# Altium footprint library Connectors.PcbLib: 79 footprints (part 3 of 5)
Each footprint in its own frame and in the unit in brackets; x right, y up, seen from the top. Pads: shape width x height; smd on the part's side, far side on the other; paste and mask are expansions set on the pad; w line width, h text height; cw(c..) or ccw(c..) is an arc to the next point about the centre after c.
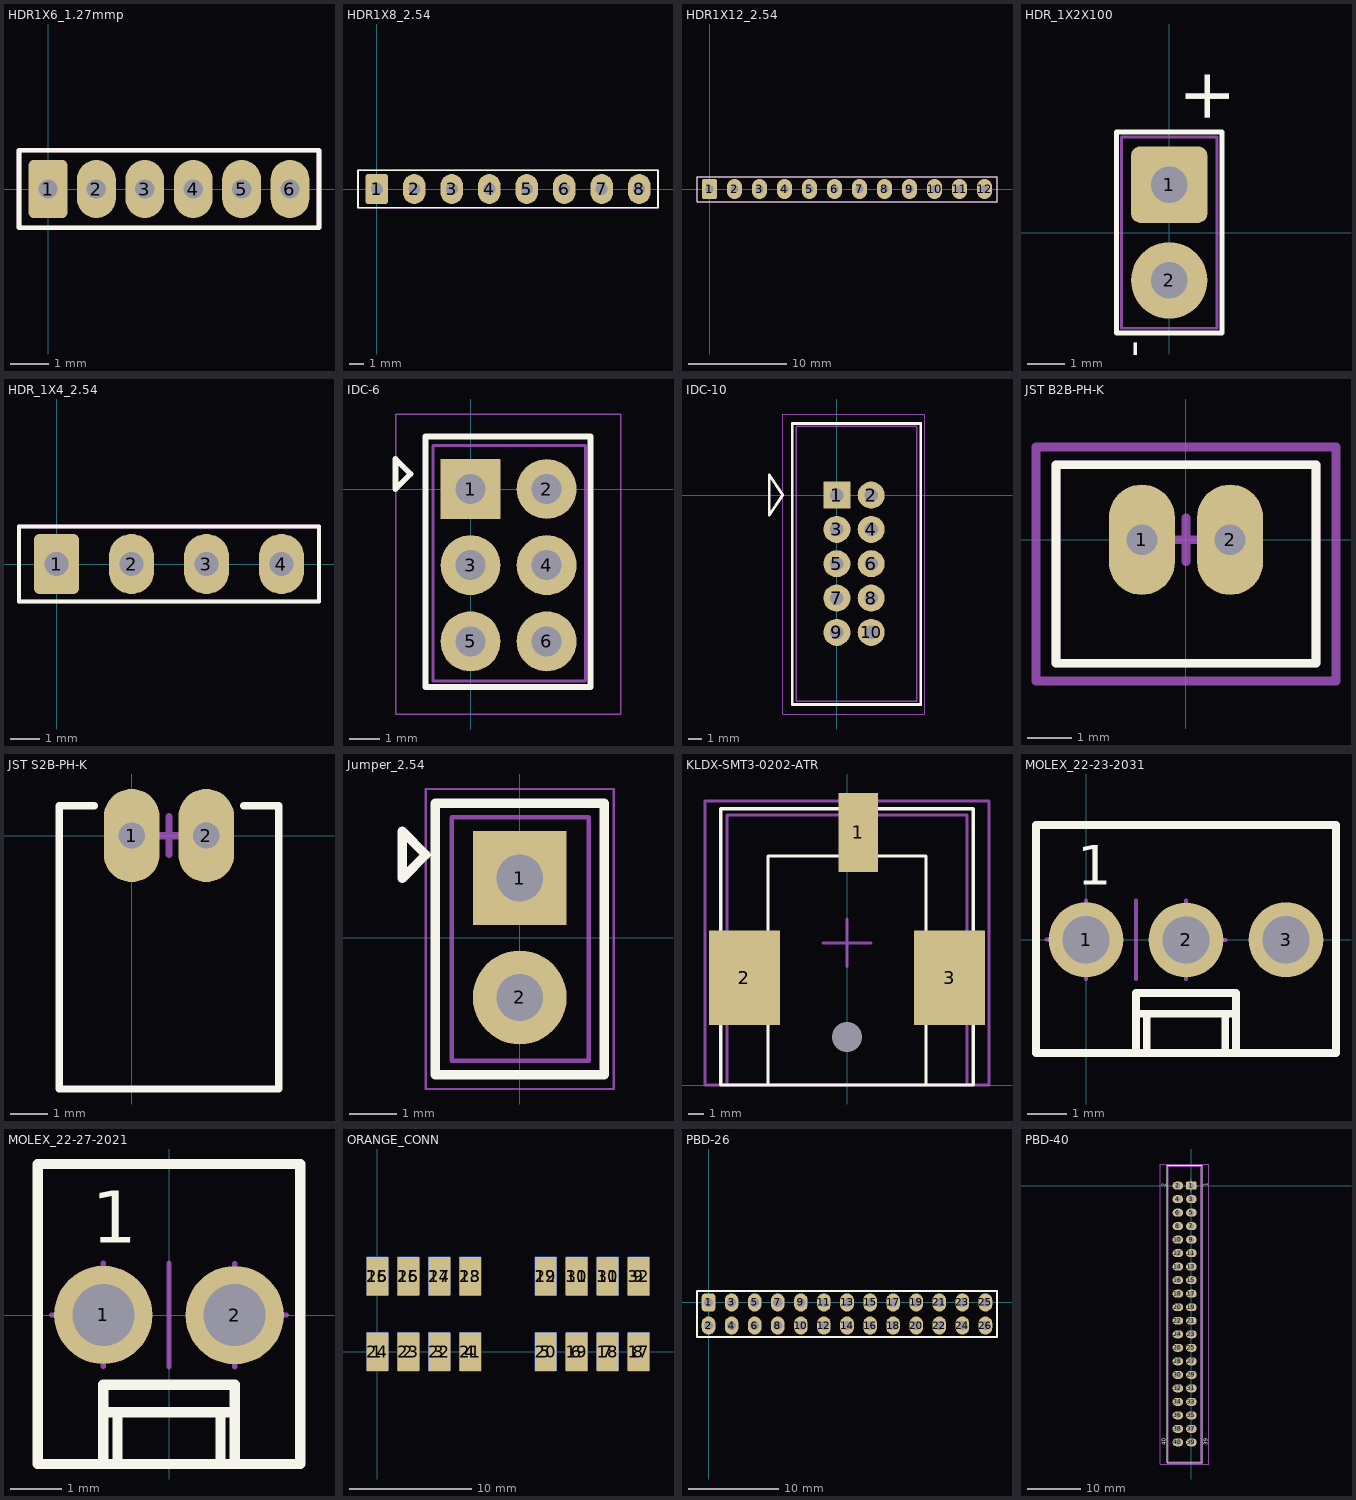
[diagram p2: the footprints below, top view; thin cyan lines are the x and y axes]

## HDR1X6_1.27mmp [mil] "Connector; Header; 6 Position, 0.050\" pitch"
pads (6):
  rrect25% 40x60 hole 20: 1(0,0)
  oval 40x60 hole 20: 2(50,0) 3(100,0) 4(150,0) 5(200,0) 6(250,0)
Top Overlay:
  lines w5: -30,-40 -30,40 280,40 280,-40 -30,-40
Bottom Solder:
  rectangle: 0,-30 250,30
Mechanical 13:
  lines w5: -30,-40 -30,40 280,40 280,-40 -30,-40

## HDR1X8_2.54 [mil]
pads (8):
  rrect25% 60x80 hole 32: 1(0,0)
  oval 60x80 hole 32: 2(100,0) 3(200,0) 4(300,0) 5(400,0) 6(500,0) 7(600,0) 8(700,0)
Top Overlay:
  lines w5: -50,-50 750,-50 750,50 -50,50 -50,-50
Mechanical 13:
  lines w5: -50,-50 750,-50 750,50 -50,50 -50,-50

## HDR1X12_2.54 [mil]
pads (12):
  rrect25% 60x80 hole 32: 1(0,0)
  oval 60x80 hole 32: 2(100,0) 3(200,0) 4(300,0) 5(400,0) 6(500,0) 7(600,0) 8(700,0) 9(800,0) 10(900,0) 11(1000,0) 12(1100,0)
Top Overlay:
  lines w5: -50,-50 1150,-50 1150,50 -50,50 -50,-50
Mechanical 13:
  lines w5: -50,-50 -50,50 1150,50 1150,-50 -50,-50

## HDR_1X2X100 [mil]
pads (2):
  rrect25% 80x80 hole 38: 1(0,50)
  round 80 hole 38: 2(0,-50)
Top Overlay:
  lines w5: -55,-105 55,-105 55,105 -55,105 -55,-105
  text "-" at 0,-111.22 h90
  text "+" at 0,112.2 h90
Mechanical 13:
  lines w3: -50,-100 50,-100 50,100 -50,100 -50,-100
3D body: height -3, standoff -5, extent -19.84,-19.96 20,19.96

## HDR_1X4_2.54 [mil]
pads (4):
  rrect25% 60x80 hole 32: 1(0,0)
  oval 60x80 hole 32: 2(100,0) 3(200,0) 4(300,0)
Top Overlay:
  lines w5: -50,-50 -50,50 350,50 350,-50 -50,-50
Mechanical 13:
  lines w5: -50,-50 -50,50 350,50 350,-50 -50,-50
3D body "Header_Male_4Pin.STEP": height 336.22, standoff -118.11, extent -50,-49.01 350,49.02

## IDC-6 [mm]
pads (6):
  rect 2x2 hole 1: 1(0,0)
  round 2 hole 1: 2(2.54,0) 3(0,-2.54) 4(2.54,-2.54) 5(0,-5.08) 6(2.54,-5.08)
Top Overlay:
  lines w0.2: -2.5,1 -2.5,0 -2,0.5 -2.5,1 ; -2.5,1 -2.5,1 ; -1.5,-6.6 -1.5,1.75 4,1.75 4,-6.6 -1.5,-6.6
Mechanical 13:
  lines w0.1: -1.255,-6.4 -1.255,1.45 3.825,1.45 3.825,-6.4 -1.255,-6.4
Mechanical 15:
  lines w0.05: -2.5,-7.5 -2.5,2.5 5,2.5 5,-7.5 -2.5,-7.5
3D body "User Library-IDC6.step": height 8, standoff -3, extent -1.24,-6.4 3.84,1.22

## IDC-10 [mm]
pads (10):
  rect 2x2 hole 1: 1(0,0)
  round 2 hole 1: 2(2.54,0) 3(0,-2.54) 4(2.54,-2.54) 5(0,-5.08) 6(2.54,-5.08) 7(0,-7.62) 8(2.54,-7.62) 9(0,-10.16) 10(2.54,-10.16)
Top Overlay:
  lines w0.2: -5,-1.5 -4,0 -5,1.5 -5,-1.5 ; -3.3,-15.5 -3.3,5.3 6.2,5.3 6.2,-15.5 -3.3,-15.5
Mechanical 13:
  lines w0.1: -3,-15.24 5.9,-15.24 5.9,5.08 -3,5.08 -3,-15.24
Mechanical 15:
  lines w0.05: -4,-16.2 -4,6 6.5,6 6.5,-16.2 -4,-16.2
3D body "User Library-IDC Socket Male 10pin Straight THT Goldplated 2_54mm.step": height 8.93, standoff -3.47, extent -2.98,-15.23 5.87,5.07

## JST B2B-PH-K [mm]
height 6
pads (2):
  oval 1.5x2.5 hole 0.7: 1(-1,0) 2(1,0)
Top Overlay:
  lines w0.2: -2.95,-2.8 -2.95,1.7 2.95,1.7 2.95,-2.8 -2.95,-2.8
Bottom Overlay:
  circle w0.254: c-2.1,1.1 r0.141
Mechanical 13:
  lines w0.2: -2.95,-2.8 2.95,-2.8 2.95,1.7 -2.95,1.7 -2.95,-2.8
Mechanical 15:
  lines w0.2: -0.5,0 0.5,0 ; 0,-0.5 0,0.5 ; -3.4,-3.2 3.4,-3.2 3.4,2.1 -3.4,2.1 -3.4,-3.2
3D body "JST B2B-PH-K-S.STEP": height 6, standoff -3.4, extent -2.95,-2.8 2.95,1.7

## JST S2B-PH-K [mm]
height 6
pads (2):
  oval 1.5x2.5 hole 0.7: 1(0,0) 2(2,0)
Top Overlay:
  lines w0.2: -1,0.8 -1.95,0.8 -1.95,-6.8 3.95,-6.8 3.95,0.8 3,0.8
Bottom Overlay:
  circle w0.254: c-1.1,1.1 r0.141
Mechanical 15:
  lines w0.2: 0.5,0 1.5,0 ; 1,-0.5 1,0.5
3D body "User Library-PCB HEADER (JST SxB-PH-K-S (RIGHT ANGLE)).step": height 4.8, standoff -2, extent -1.95,-6.775 3.95,0.825

## Jumper_2.54 [mm]
pads (2):
  rect 2x2 hole 1: 1(0,1.27)
  round 2 hole 1: 2(0,-1.27)
Top Overlay:
  lines w0.2: -2.5,2.27 -2.5,1.27 -2,1.77 -2.5,2.27 ; -2.5,2.27 -2.5,2.27 ; -1.8,-2.92 1.8,-2.92 1.8,2.87 -1.8,2.87 -1.8,-2.92
Mechanical 13:
  lines w0.1: -1.45,-2.62 1.47,-2.62 1.47,2.57 -1.45,2.57 -1.45,-2.62
Mechanical 15:
  lines w0.05: -2,-3.22 2,-3.22 2,3.17 -2,3.17 -2,-3.22
3D body "SW3dPS-Jumper SL2.STEP": height 9.5, standoff -2.6, extent -1.27,-2.5 1.27,2.5

## KLDX-SMT3-0202-ATR [mm]
pads (4):
  round 0 hole 1.9 unplated: 0(0,3.05)
  rect 2.5x5 smd: 1(0.7,16)
  rect 4.5x6 smd: 2(-6.5,6.8) 3(6.5,6.8)
Top Overlay:
  lines w0.2: -5,0 -5,14.5 5,14.5 5,0 ; -8,0 -8,17.5 8,17.5 8,0 -8,0
Mechanical 13:
  lines w0.2: -7.6,0 -7.6,17.1 7.6,17.1 7.6,0 -7.6,0
Mechanical 15:
  lines w0.2: -1.5,9 1.5,9 ; 0,7.5 0,9 0,10.5 ; -9,0 -9,18 9,18 9,0 -9,0
3D body "KLDX-SMT3-0202-ATR_rA1.STEP": height 11.15, standoff -1.45, extent -7.6,0 7.6,17.1

## MOLEX_22-23-2031 [mm] "2.54mm (.100\") Pitch KK® Header, Single Row, Vertical, 2 Circuits"
height 11.7
pads (3):
  round 1.9 hole 1.2: 1(0,0) 2(2.54,-0.005) 3(5.08,-0.002)
Top Overlay:
  lines w0.2: 1.27,-2.883 1.27,-1.352 3.81,-1.352 3.81,-2.883 ; 1.27,-1.883 3.81,-1.883 ; 1.543,-2.883 1.543,-1.883 ; 3.537,-2.883 3.537,-1.883 ; -1.27,-2.883 -1.27,2.918 6.35,2.918 6.35,-2.883 -1.27,-2.883
  text "1" at -0.22,1.395 h1
Mechanical 8:
  lines w0.1: -1,0 0,0 ; 0,-1 0,0 ; 0,1 0,0 ; 1.27,-1.002 1.27,-0.002 1.27,0.998 ; 2.54,-1.005 2.54,-0.005 ; 2.54,0.995 2.54,-0.005 ; 3.54,-0.005 2.54,-0.005
Mechanical 14:
  lines w0.1: 1.27,-2.883 1.27,-1.352 3.81,-1.352 3.81,-2.883 ; 1.27,-1.883 3.81,-1.883 ; 1.543,-2.883 1.543,-1.883 ; 3.537,-2.883 3.537,-1.883 ; -1.27,-2.883 -1.27,2.918 6.35,2.918 6.35,-2.883 -1.27,-2.883 ; -0.32,-0.318 -0.32,0.318 0.32,0.318 0.32,-0.318 -0.32,-0.318 ; 2.22,-0.322 2.86,-0.322 2.86,0.318 2.22,0.318 2.22,-0.322
  text "1" at -0.22,1.395 h1
3D body "SW3dPS-Molex - 3-Pin Header with Lock (0.100in pitch).STEP": height 10.69, standoff -3.53, extent -1.27,-3.175 6.35,3.175

## MOLEX_22-27-2021 [mm] "2.54mm (.100\") Pitch KK® Header, Single Row, Vertical, 2 Circuits"
height 11.7
pads (2):
  round 1.9 hole 1.2: 1(-1.27,0.002) 2(1.27,-0.002)
Top Overlay:
  lines w0.2: -1.27,-2.88 -1.27,-1.35 1.27,-1.35 1.27,-2.88 ; -1.27,-1.88 1.27,-1.88 ; -0.997,-2.88 -0.997,-1.88 ; 0.997,-2.88 0.997,-1.88 ; -2.54,-2.88 -2.54,2.92 2.54,2.92 2.54,-2.88 -2.54,-2.88
  text "1" at -1.49,1.397 h1
Mechanical 8:
  lines w0.1: -2.27,0.002 -1.27,0.002 ; -1.27,-0.998 -1.27,0.002 ; -1.27,1.002 -1.27,0.002 ; 0,-1 0,0 0,1 ; 1.27,-1.002 1.27,-0.002 ; 1.27,0.998 1.27,-0.002 ; 2.27,-0.002 1.27,-0.002
Mechanical 14:
  lines w0.1: -1.27,-2.88 -1.27,-1.35 1.27,-1.35 1.27,-2.88 ; -1.27,-1.88 1.27,-1.88 ; -0.997,-2.88 -0.997,-1.88 ; 0.997,-2.88 0.997,-1.88 ; -2.54,-2.88 -2.54,2.92 2.54,2.92 2.54,-2.88 -2.54,-2.88 ; -1.59,-0.315 -1.59,0.32 -0.95,0.32 -0.95,-0.315 -1.59,-0.315 ; 0.95,-0.32 1.59,-0.32 1.59,0.32 0.95,0.32 0.95,-0.32
  text "1" at -1.49,1.397 h1
3D body "MOLEX_22-27-2021.stp": height 11.7, standoff -3.56, extent -2.54,-2.88 2.54,2.92

## ORANGE_CONN [mm]
pads (32):
  rrect10% 1.8x3.2 smd: 1(0,0) 2(2.54,0) 3(5.08,0) 4(7.62,0) 5(13.82,0) 6(16.36,0) 7(18.9,0) 8(21.44,0) 9(21.44,6.2) 10(18.9,6.2) 11(16.36,6.2) 12(13.82,6.2) 13(7.62,6.2) 14(5.08,6.2) 15(2.54,6.2) 16(0,6.2)
  rrect10% 1.8x3.2 smd far side: 17(21.44,0) 18(18.9,0) 19(16.36,0) 20(13.82,0) 21(7.62,0) 22(5.08,0) 23(2.54,0) 24(0,0) 25(0,6.2) 26(2.54,6.2) 27(5.08,6.2) 28(7.62,6.2) 29(13.82,6.2) 30(16.36,6.2) 31(18.9,6.2) 32(21.44,6.2)

## PBD-26 [mm] "Connector; Header; 13x2 Position"
height 8
pads (26):
  rrect50% 1.5x2 hole 1: 1(0,0)
  oval 1.5x2 hole 1: 2(0,-2.54) 3(2.54,0) 4(2.54,-2.54) 5(5.08,0) 6(5.08,-2.54) 7(7.62,0) 8(7.62,-2.54) 9(10.16,0) 10(10.16,-2.54) 11(12.7,0) 12(12.7,-2.54) 13(15.24,0) 14(15.24,-2.54) 15(17.78,0) 16(17.78,-2.54) 17(20.32,0) 18(20.32,-2.54) 19(22.86,0) 20(22.86,-2.54) 21(25.4,0) 22(25.4,-2.54) 23(27.94,0) 24(27.94,-2.54) 25(30.48,0) 26(30.48,-2.54)
Top Overlay:
  lines w0.2: -1.27,-3.81 31.75,-3.81 31.75,1.27 -1.27,1.27 -1.27,-3.81
3D body "PBD-2.stp": height 8.5, standoff -3.15, extent 29.21,-3.81 31.75,1.27
3D body "PBD-2.stp": height 8.5, standoff -3.15, extent 3.81,-3.81 6.35,1.27
3D body "PBD-2.stp": height 8.5, standoff -3.15, extent -1.27,-3.81 1.27,1.27
3D body "PBD-2.stp": height 8.5, standoff -3.15, extent 1.27,-3.81 3.81,1.27
3D body "PBD-2.stp": height 8.5, standoff -3.15, extent 11.43,-3.81 13.97,1.27
3D body "PBD-2.stp": height 8.5, standoff -3.15, extent 6.35,-3.81 8.89,1.27
3D body "PBD-2.stp": height 8.5, standoff -3.15, extent 8.89,-3.81 11.43,1.27
3D body "PBD-2.stp": height 8.5, standoff -3.15, extent 19.05,-3.81 21.59,1.27
3D body "PBD-2.stp": height 8.5, standoff -3.15, extent 13.97,-3.81 16.51,1.27
3D body "PBD-2.stp": height 8.5, standoff -3.15, extent 16.51,-3.81 19.05,1.27
3D body "PBD-2.stp": height 8.5, standoff -3.15, extent 26.67,-3.81 29.21,1.27
3D body "PBD-2.stp": height 8.5, standoff -3.15, extent 21.59,-3.81 24.13,1.27
3D body "PBD-2.stp": height 8.5, standoff -3.15, extent 24.13,-3.81 26.67,1.27

## PBD-40 [mm] "SOCKET BRD MNT 40POS 2.54MM"
height 10.8
pads (40):
  rrect25% 2x1.5 hole 1: 1(0,0)
  oval 2x1.5 hole 1: 2(-2.54,0) 3(0,-2.54) 4(-2.54,-2.54) 5(0,-5.08) 6(-2.54,-5.08) 7(0,-7.62) 8(-2.54,-7.62) 9(0,-10.16) 10(-2.54,-10.16) 11(0,-12.7) 12(-2.54,-12.7) 13(0,-15.24) 14(-2.54,-15.24) 15(0,-17.78) 16(-2.54,-17.78) 17(0,-20.32) 18(-2.54,-20.32) 19(0,-22.86) 20(-2.54,-22.86) 21(0,-25.4) 22(-2.54,-25.4) 23(0,-27.94) 24(-2.54,-27.94) 25(0,-30.48) 26(-2.54,-30.48) 27(0,-33.02) 28(-2.54,-33.02) 29(0,-35.56) 30(-2.54,-35.56) 31(0,-38.1) 32(-2.54,-38.1) 33(0,-40.64) 34(-2.54,-40.64) 35(0,-43.18) 36(-2.54,-43.18) 37(0,-45.72) 38(-2.54,-45.72) 39(0,-48.26) 40(-2.54,-48.26)
Top Overlay:
  lines w0.127: -4.572,-52.07 -4.572,3.81 2.032,3.81 2.032,-52.07 -4.572,-52.07
  text "40" at -4.826,-48.844 h0.76
  text "39" at 3.048,-48.844 h0.76
  text "2" at -4.826,-0.254 h0.76
  text "1" at 3.048,-0.127 h0.76
Mechanical 13:
  lines w0.076: -4.32,-51.86 1.78,-51.86 1.78,3.6 -4.32,3.6 -4.32,-51.86
Mechanical 15:
  lines w0.076: -1.27,0 1.27,0 ; 0,-1.27 0,1.27 ; -5.842,-52.324 -5.842,4.064 3.302,4.064 3.302,-52.324 -5.842,-52.324
3D body "User Library-PBD2_54-40.step": height 8.4, standoff -2.7, extent -3.79,-49.575 1.29,1.225